# Altium schematic symbol library IC_TI.SCHLIB: 1162 symbols (part 6 of 8)
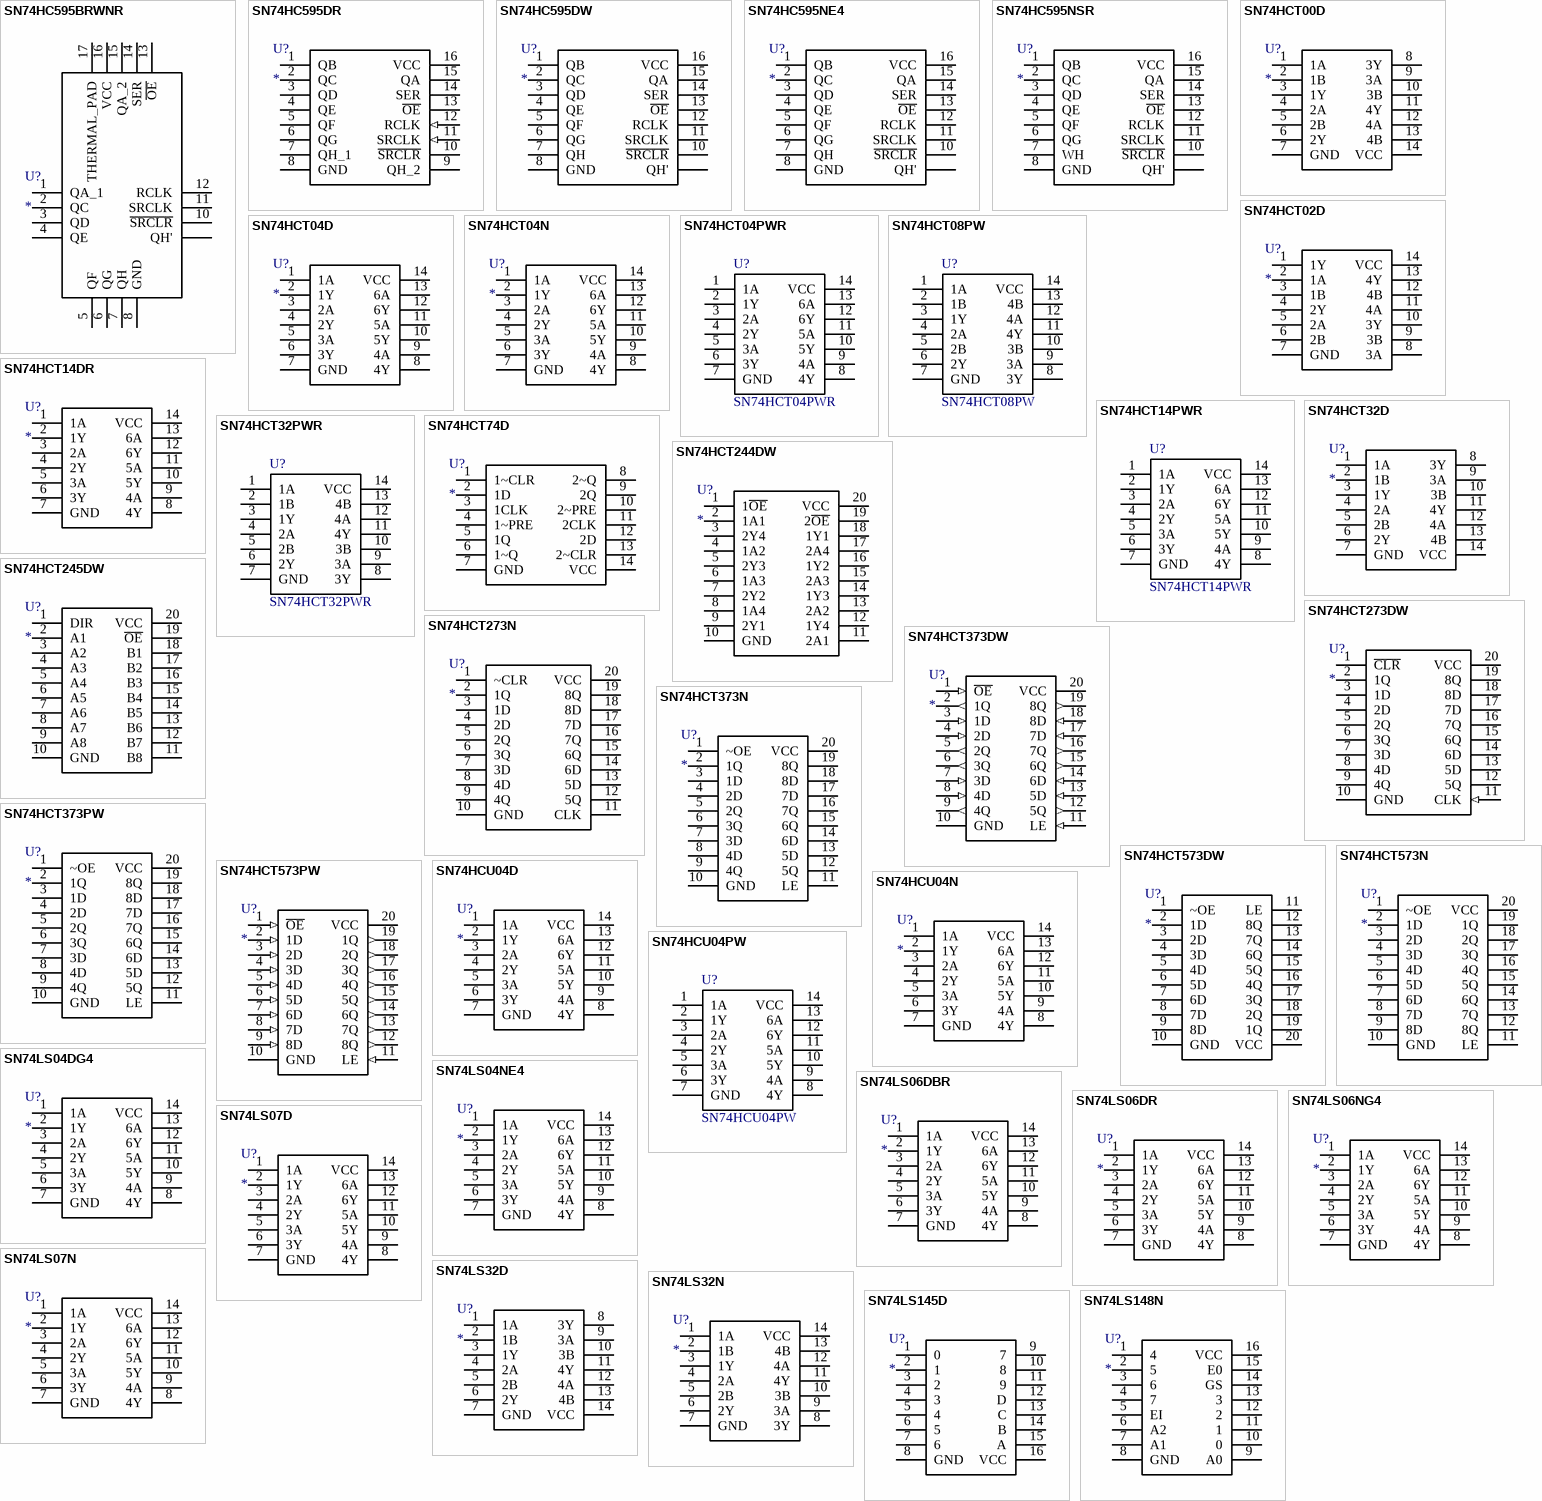
[diagram p40: symbols SN74HC595BRWNR to SN74LS148N]

## SN74LS07D
designator U?
Integrated Circuit; Manufacturer_Name: Texas Instruments; Manufacturer_Part_Number: SN74LS07D; Datasheet Link: http://www.ti.com/lit/ds/symlink/sn74ls07.pdf; Height: 1.75mm; Mouser Part Number: 595-SN74LS07D; Mouser Price/Stock: https://www.mouser.com/Search/Refine.aspx?Keyword=595-SN74LS07D; RS Part Number: 1218515; RS Price/Stock: http://uk.rs-online.com/web/p/products/1218515
footprint SOIC14_1.27
pins: 1 1A, 2 1Y, 3 2A, 4 2Y, 5 3A, 6 3Y, 7 GND (power), 8 4Y, 9 4A, 10 5Y, 11 5A, 12 6Y, 13 6A, 14 VCC (power)

## SN74LS07N
designator U?
Integrated Circuit; Manufacturer_Name: Texas Instruments; Manufacturer_Part_Number: SN74LS07N; Datasheet Link: http://componentsearchengine.com/Datasheets/1/SN74LS07N.pdf; Mouser Part Number: 595-SN74LS07N; Mouser Price/Stock: https://www.mouser.com/Search/Refine.aspx?Keyword=595-SN74LS07N; RS Part Number: 0442808; RS Price/Stock: http://uk.rs-online.com/web/p/products/0442808
footprint DIP14
pins: 1 1A, 2 1Y, 3 2A, 4 2Y, 5 3A, 6 3Y, 7 GND, 8 4Y, 9 4A, 10 5Y, 11 5A, 12 6Y, 13 6A, 14 VCC

## SN74LS32D
designator U?
Integrated Circuit; Manufacturer_Name: Texas Instruments; Manufacturer_Part_Number: SN74LS32D; Datasheet Link: http://componentsearchengine.com/Datasheets/3/SN74LS32D.pdf; Mouser Part Number: 595-SN74LS32D; Mouser Price/Stock: https://www.mouser.com/Search/Refine.aspx?Keyword=595-SN74LS32D; RS Part Number: 1792177; RS Price/Stock: http://uk.rs-online.com/web/p/products/1792177
footprint SOIC14_1.27
pins: 1 1A, 2 1B, 3 1Y, 4 2A, 5 2B, 6 2Y, 7 GND, 8 3Y, 9 3A, 10 3B, 11 4Y, 12 4A, 13 4B, 14 VCC

## SN74LS32N
designator U?
Integrated Circuit; Manufacturer_Name: Texas Instruments; Manufacturer_Part_Number: SN74LS32N; Datasheet Link: http://componentsearchengine.com/Datasheets/3/SN74LS32N.pdf; Mouser Part Number: 595-SN74LS32N; Mouser Price/Stock: https://www.mouser.com/Search/Refine.aspx?Keyword=595-SN74LS32N; RS Part Number: 3686382; RS Price/Stock: http://uk.rs-online.com/web/p/products/3686382
footprint DIP14
pins: 1 1A, 2 1B, 3 1Y, 4 2A, 5 2B, 6 2Y, 7 GND, 8 3Y, 9 3A, 10 3B, 11 4Y, 12 4A, 13 4B, 14 VCC

## SN74LS145D
designator U?
Integrated Circuit; Manufacturer_Name: Texas Instruments; Manufacturer_Part_Number: SN74LS145D; Mouser Part Number: 595-SN74LS145D; Mouser Price/Stock: https://www.mouser.com/Search/Refine.aspx?Keyword=595-SN74LS145D; RS Part Number: 1451076; RS Price/Stock: http://uk.rs-online.com/web/p/products/1451076
footprint SOIC16_1.27
pins: 1 0, 2 1, 3 2, 4 3, 5 4, 6 5, 7 6, 8 GND, 9 7, 10 8, 11 9, 12 D, 13 C, 14 B, 15 A, 16 VCC

## SN74LS148N
designator U?
Integrated Circuit; Manufacturer_Name: Texas Instruments; Manufacturer_Part_Number: SN74LS148N; Datasheet Link: http://docs-emea.rs-online.com/webdocs/00a3/0900766b800a3b12.pdf; Height: 5.08mm; Mouser Part Number: 595-SN74LS148N; Mouser Price/Stock: https://www.mouser.com/Search/Refine.aspx?Keyword=595-SN74LS148N; RS Part Number: 0640103P; RS Price/Stock: http://uk.rs-online.com/web/p/products/0640103P
footprint DIP16-A
pins: 1 4, 2 5, 3 6, 4 7, 5 EI, 6 A2, 7 A1, 8 GND (power), 9 A0, 10 0, 11 1, 12 2, 13 3, 14 GS, 15 E0, 16 VCC (power)

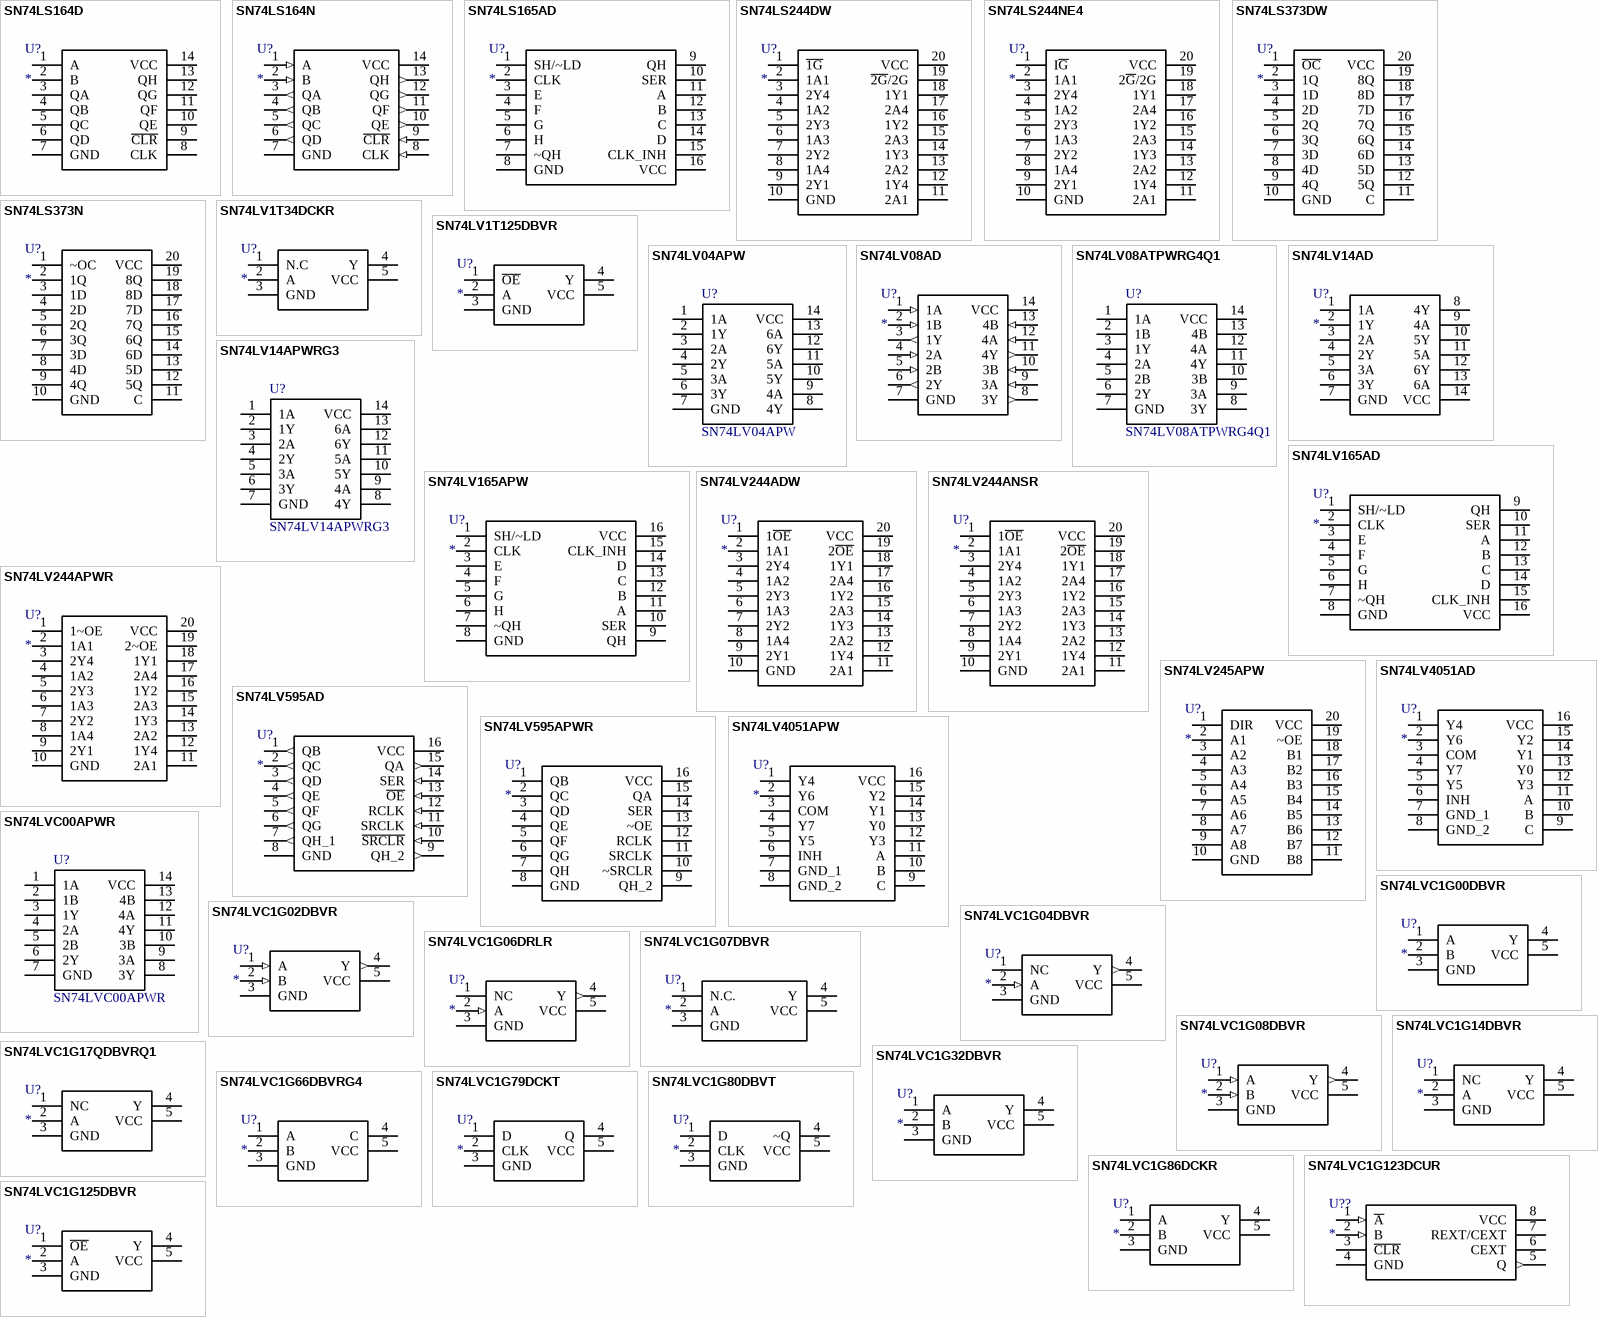
[diagram p23: symbols SN74LS164D to SN74LVC1G125DBVR]

## SN74LS164D
designator U?
Integrated Circuit; Manufacturer_Name: Texas Instruments; Manufacturer_Part_Number: SN74LS164D; Datasheet Link: http://uk.rs-online.com/web/p/products/6632448; Height: 1.75mm; Mouser Part Number: 595-SN74LS164D; Mouser Price/Stock: https://www.mouser.com/Search/Refine.aspx?Keyword=595-SN74LS164D; RS Part Number: 6632448; RS Price/Stock: http://uk.rs-online.com/web/p/products/6632448
footprint SOIC14_1.27
pins: 1 A, 2 B, 3 QA, 4 QB, 5 QC, 6 QD, 7 GND, 8 CLK, 9 ~{CLR}, 10 QE, 11 QF, 12 QG, 13 QH, 14 VCC

## SN74LS164N
designator U?
Integrated Circuit; Manufacturer_Name: Texas Instruments; Manufacturer_Part_Number: SN74LS164N; Datasheet Link: http://uk.rs-online.com/web/p/products/0305018; Height: 5.08mm; Mouser Part Number: 595-SN74LS164N; Mouser Price/Stock: https://www.mouser.com/Search/Refine.aspx?Keyword=595-SN74LS164N; RS Part Number: 0305018P; RS Price/Stock: http://uk.rs-online.com/web/p/products/0305018P
footprint DIP14-A
pins: 1 A (in), 2 B (in), 3 QA (out), 4 QB (out), 5 QC (out), 6 QD (out), 7 GND (power), 8 CLK (in), 9 ~{CLR} (in), 10 QE (out), 11 QF (out), 12 QG (out), 13 QH (out), 14 VCC (power)

## SN74LS165AD
designator U?
Integrated Circuit; Manufacturer_Name: Texas Instruments; Manufacturer_Part_Number: SN74LS165AD; Mouser Part Number: 595-SN74LS165AD; Mouser Price/Stock: https://www.mouser.com/Search/Refine.aspx?Keyword=595-SN74LS165AD; RS Part Number: 6632442P; RS Price/Stock: http://uk.rs-online.com/web/p/products/6632442P
footprint SOIC16_1.27
pins: 1 SH/~LD, 2 CLK, 3 E, 4 F, 5 G, 6 H, 7 ~QH, 8 GND, 9 QH, 10 SER, 11 A, 12 B, 13 C, 14 D, 15 CLK_INH, 16 VCC

## SN74LS244DW
designator U?
Integrated Circuit; Manufacturer_Name: Texas Instruments; Manufacturer_Part_Number: SN74LS244DW; Datasheet Link: http://www.ti.com/lit/ds/symlink/sn74ls244.pdf; Height: 2.65mm; Mouser Part Number: 595-SN74LS244DW; Mouser Price/Stock: https://www.mouser.com/Search/Refine.aspx?Keyword=595-SN74LS244DW; RS Part Number: 1218344; RS Price/Stock: http://uk.rs-online.com/web/p/products/1218344
footprint SOIC20W_1.27
pins: 1 ~{1G}, 2 1A1, 3 2Y4, 4 1A2, 5 2Y3, 6 1A3, 7 2Y2, 8 1A4, 9 2Y1, 10 GND (power), 11 2A1, 12 1Y4, 13 2A2, 14 1Y3, 15 2A3, 16 1Y2, 17 2A4, 18 1Y1, 19 ~{2G}/2G, 20 VCC (power)

## SN74LS244NE4
designator U?
Integrated Circuit; Manufacturer_Name: Texas Instruments; Manufacturer_Part_Number: SN74LS244NE4; Datasheet Link: http://www.ti.com/lit/ds/symlink/sn74ls241.pdf; Height: 5.08mm; Mouser Part Number: 595-SN74LS244NE4; Mouser Price/Stock: https://www.mouser.com/Search/Refine.aspx?Keyword=595-SN74LS244NE4
footprint DIP20-A
pins: 1 I~{G}, 2 1A1, 3 2Y4, 4 1A2, 5 2Y3, 6 1A3, 7 2Y2, 8 1A4, 9 2Y1, 10 GND, 11 2A1, 12 1Y4, 13 2A2, 14 1Y3, 15 2A3, 16 1Y2, 17 2A4, 18 1Y1, 19 2~{G}/2G, 20 VCC

## SN74LS373DW
designator U?
Integrated Circuit; Manufacturer_Name: Texas Instruments; Manufacturer_Part_Number: SN74LS373DW; Datasheet Link: http://docs-emea.rs-online.com/webdocs/0b85/0900766b80b85e6b.pdf; Height: 2.65mm; Mouser Part Number: 595-SN74LS373DW; Mouser Price/Stock: https://www.mouser.com/Search/Refine.aspx?Keyword=595-SN74LS373DW; RS Part Number: 0527334; RS Price/Stock: http://uk.rs-online.com/web/p/products/0527334
footprint SOIC20W_1.27
pins: 1 ~{OC}, 2 1Q, 3 1D, 4 2D, 5 2Q, 6 3Q, 7 3D, 8 4D, 9 4Q, 10 GND (power), 11 C, 12 5Q, 13 5D, 14 6D, 15 6Q, 16 7Q, 17 7D, 18 8D, 19 8Q, 20 VCC (power)

## SN74LS373N
designator U?
Integrated Circuit; Manufacturer_Name: Texas Instruments; Manufacturer_Part_Number: SN74LS373N; Datasheet Link: http://www.ti.com/lit/gpn/sn74ls373; Mouser Part Number: 595-SN74LS373N; Mouser Price/Stock: https://www.mouser.com/Search/Refine.aspx?Keyword=595-SN74LS373N; RS Part Number: 0309256; RS Price/Stock: http://uk.rs-online.com/web/p/products/0309256
footprint DIP20
pins: 1 ~OC, 2 1Q, 3 1D, 4 2D, 5 2Q, 6 3Q, 7 3D, 8 4D, 9 4Q, 10 GND, 11 C, 12 5Q, 13 5D, 14 6D, 15 6Q, 16 7Q, 17 7D, 18 8D, 19 8Q, 20 VCC

## SN74LV1T34DCKR
designator U?
Integrated Circuit; Manufacturer_Name: Texas Instruments; Manufacturer_Part_Number: SN74LV1T34DCKR; Datasheet Link: http://www.ti.com/lit/gpn/sn74lv1t34; Height: 1.1mm; Mouser Part Number: 595-SN74LV1T34DCKR; Mouser Price/Stock: https://www.mouser.com/Search/Refine.aspx?Keyword=595-SN74LV1T34DCKR
footprint SOT353
pins: 1 N.C, 2 A, 3 GND, 4 Y, 5 VCC

## SN74LV1T125DBVR
designator U?
Integrated Circuit; Manufacturer_Name: Texas Instruments; Manufacturer_Part_Number: SN74LV1T125DBVR; Datasheet Link: http://www.ti.com/general/docs/lit/getliterature.tsp?genericPartNumber=SN74LV1T125&&fileType=pdf; Height: 1.45mm; Mouser Part Number: 595-SN74LV1T125DBVR; Mouser Price/Stock: https://www.mouser.com/Search/Refine.aspx?Keyword=595-SN74LV1T125DBVR
footprint SOT23-5 (SOT23, 5-Leads, Body 3.0x3.0mm (max), Pitch 0.95mm, IPC Medium Density)
pins: 1 ~{OE}, 2 A, 3 GND, 4 Y, 5 VCC

## SN74LV04APW
designator U?
Integrated Circuit; Manufacturer_Name: Texas Instruments; Manufacturer_Part_Number: SN74LV04APW; Mouser Part Number: 595-SN74LV04APW; Mouser Price/Stock: https://www.mouser.com/Search/Refine.aspx?Keyword=595-SN74LV04APW
footprint TSSOP14_0.65 (TSOP, 14-Leads, Body 5.00x4.40mm, Pitch 0.65mm, Thermal Pad 2.31x2.46mm, IPC Low Density)
pins: 1 1A, 2 1Y, 3 2A, 4 2Y, 5 3A, 6 3Y, 7 GND, 8 4Y, 9 4A, 10 5Y, 11 5A, 12 6Y, 13 6A, 14 VCC

## SN74LV08AD
designator U?
Integrated Circuit; Manufacturer_Name: Texas Instruments; Manufacturer_Part_Number: SN74LV08AD; Datasheet Link: http://www.ti.com/lit/ds/scls387m/scls387m.pdf; Height: 1.75mm; Mouser Part Number: 595-SN74LV08AD; Mouser Price/Stock: https://www.mouser.com/Search/Refine.aspx?Keyword=595-SN74LV08AD; RS Part Number: 1792183; RS Price/Stock: http://uk.rs-online.com/web/p/products/1792183
footprint SOIC14_1.27
pins: 1 1A (in), 2 1B (in), 3 1Y (out), 4 2A (in), 5 2B (in), 6 2Y (out), 7 GND (power), 8 3Y (out), 9 3A (in), 10 3B (in), 11 4Y (out), 12 4A (in), 13 4B (in), 14 VCC (power)

## SN74LV08ATPWRG4Q1
designator U?
Integrated Circuit; Manufacturer_Name: Texas Instruments; Datasheet Link: http://www.ti.com/lit/gpn/sn74lv08a-q1; Height: 1.2mm; Manufacturer_Part_Number: SN74LV08ATPWRG4Q1; Mouser Part Number: 595-N74LV08ATPWRG4Q1; Mouser Price/Stock: https://www.mouser.com/Search/Refine.aspx?Keyword=595-N74LV08ATPWRG4Q1
footprint TSSOP14_0.65 (TSOP, 14-Leads, Body 5.00x4.40mm, Pitch 0.65mm, Thermal Pad 2.31x2.46mm, IPC Low Density)
pins: 1 1A, 2 1B, 3 1Y, 4 2A, 5 2B, 6 2Y, 7 GND, 8 3Y, 9 3A, 10 3B, 11 4Y, 12 4A, 13 4B, 14 VCC

## SN74LV14AD
designator U?
Integrated Circuit; Manufacturer_Name: Texas Instruments; Manufacturer_Part_Number: SN74LV14AD; Datasheet Link: http://www.ti.com/lit/gpn/sn74lv14a; Mouser Part Number: 595-SN74LV14AD; Mouser Price/Stock: https://www.mouser.com/Search/Refine.aspx?Keyword=595-SN74LV14AD; RS Part Number: 1450723; RS Price/Stock: http://uk.rs-online.com/web/p/products/1450723
footprint SOIC14_1.27
pins: 1 1A, 2 1Y, 3 2A, 4 2Y, 5 3A, 6 3Y, 7 GND, 8 4Y, 9 4A, 10 5Y, 11 5A, 12 6Y, 13 6A, 14 VCC

## SN74LV14APWRG3
designator U?
Integrated Circuit; Manufacturer_Name: Texas Instruments; Datasheet Link: http://www.ti.com/lit/ds/symlink/sn74lv14a.pdf; Height: 1.2mm; Manufacturer_Part_Number: SN74LV14APWRG3; Mouser Part Number: 595-SN74LV14APWRG3; Mouser Price/Stock: https://www.mouser.com/Search/Refine.aspx?Keyword=595-SN74LV14APWRG3
footprint TSSOP14_0.65 (TSOP, 14-Leads, Body 5.00x4.40mm, Pitch 0.65mm, Thermal Pad 2.31x2.46mm, IPC Low Density)
pins: 1 1A, 2 1Y, 3 2A, 4 2Y, 5 3A, 6 3Y, 7 GND, 8 4Y, 9 4A, 10 5Y, 11 5A, 12 6Y, 13 6A, 14 VCC

## SN74LV165AD
designator U?
Integrated Circuit; Manufacturer_Name: Texas Instruments; Manufacturer_Part_Number: SN74LV165AD; Mouser Part Number: 595-SN74LV165AD; Mouser Price/Stock: https://www.mouser.com/Search/Refine.aspx?Keyword=595-SN74LV165AD; RS Part Number: 6632713; RS Price/Stock: http://uk.rs-online.com/web/p/products/6632713
footprint SOIC16_1.27
pins: 1 SH/~LD, 2 CLK, 3 E, 4 F, 5 G, 6 H, 7 ~QH, 8 GND, 9 QH, 10 SER, 11 A, 12 B, 13 C, 14 D, 15 CLK_INH, 16 VCC

## SN74LV165APW
designator U?
Integrated Circuit; Manufacturer_Name: Texas Instruments; Manufacturer_Part_Number: SN74LV165APW; Datasheet Link: http://www.ti.com/lit/gpn/sn74lv165a; Mouser Part Number: 595-SN74LV165APW; Mouser Price/Stock: https://www.mouser.com/Search/Refine.aspx?Keyword=595-SN74LV165APW; RS Part Number: 1219235; RS Price/Stock: http://uk.rs-online.com/web/p/products/1219235
footprint TSSOP16_0.65 (Shrink Small Outline; 16 Leads; Body Width 4.4 mm; Pitch 0.65 mm)
pins: 1 SH/~LD, 2 CLK, 3 E, 4 F, 5 G, 6 H, 7 ~QH, 8 GND, 9 QH, 10 SER, 11 A, 12 B, 13 C, 14 D, 15 CLK_INH, 16 VCC

## SN74LV244ADW
designator U?
Integrated Circuit; Manufacturer_Name: Texas Instruments; Manufacturer_Part_Number: SN74LV244ADW; Datasheet Link: http://docs-emea.rs-online.com/webdocs/0b85/0900766b80b85e5e.pdf; Height: 2.65mm; Mouser Part Number: 595-SN74LV244ADW; Mouser Price/Stock: https://www.mouser.com/Search/Refine.aspx?Keyword=595-SN74LV244ADW; RS Part Number: 0526206; RS Price/Stock: http://uk.rs-online.com/web/p/products/0526206
footprint SOIC20W_1.27
pins: 1 1~{OE}, 2 1A1, 3 2Y4, 4 1A2, 5 2Y3, 6 1A3, 7 2Y2, 8 1A4, 9 2Y1, 10 GND (power), 11 2A1, 12 1Y4, 13 2A2, 14 1Y3, 15 2A3, 16 1Y2, 17 2A4, 18 1Y1, 19 2~{OE}, 20 VCC (power)

## SN74LV244ANSR
designator U?
Integrated Circuit; Manufacturer_Name: Texas Instruments; Manufacturer_Part_Number: SN74LV244ANSR; Datasheet Link: http://www.ti.com/lit/gpn/sn74lv244a; Height: 2mm; Mouser Part Number: 595-SN74LV244ANSR; Mouser Price/Stock: https://www.mouser.com/Search/Refine.aspx?Keyword=595-SN74LV244ANSR
footprint SOP20W_1.27
pins: 1 1~{OE}, 2 1A1, 3 2Y4, 4 1A2, 5 2Y3, 6 1A3, 7 2Y2, 8 1A4, 9 2Y1, 10 GND, 11 2A1, 12 1Y4, 13 2A2, 14 1Y3, 15 2A3, 16 1Y2, 17 2A4, 18 1Y1, 19 2~{OE}, 20 VCC

## SN74LV244APWR
designator U?
Integrated Circuit; Manufacturer_Name: Texas Instruments; Manufacturer_Part_Number: SN74LV244APWR; Datasheet Link: http://www.ti.com/lit/gpn/sn74lv244a; Mouser Part Number: 595-SN74LV244APWR; Mouser Price/Stock: https://www.mouser.com/Search/Refine.aspx?Keyword=595-SN74LV244APWR; RS Part Number: 6628471P; RS Price/Stock: http://uk.rs-online.com/web/p/products/6628471P
footprint TSSOP20_0.65 (TSOP, 20-Leads, Body 6.6x4.5mm (max), Pitch 0.65mm, IPC Medium Density)
pins: 1 1~OE, 2 1A1, 3 2Y4, 4 1A2, 5 2Y3, 6 1A3, 7 2Y2, 8 1A4, 9 2Y1, 10 GND, 11 2A1, 12 1Y4, 13 2A2, 14 1Y3, 15 2A3, 16 1Y2, 17 2A4, 18 1Y1, 19 2~OE, 20 VCC

## SN74LV245APW
designator U?
Integrated Circuit; Manufacturer_Name: Texas Instruments; Manufacturer_Part_Number: SN74LV245APW; Mouser Part Number: 595-SN74LV245APW; Mouser Price/Stock: https://www.mouser.com/Search/Refine.aspx?Keyword=595-SN74LV245APW
footprint TSSOP20_0.65 (TSOP, 20-Leads, Body 6.6x4.5mm (max), Pitch 0.65mm, IPC Medium Density)
pins: 1 DIR, 2 A1, 3 A2, 4 A3, 5 A4, 6 A5, 7 A6, 8 A7, 9 A8, 10 GND, 11 B8, 12 B7, 13 B6, 14 B5, 15 B4, 16 B3, 17 B2, 18 B1, 19 ~OE, 20 VCC

## SN74LV595AD
designator U?
Integrated Circuit; Manufacturer_Name: Texas Instruments; Manufacturer_Part_Number: SN74LV595AD; Datasheet Link: http://www.ti.com/lit/ds/symlink/sn74lv595a.pdf; Height: 1.75mm; RS Part Number: 527243; RS Price/Stock: http://uk.rs-online.com/web/p/counters-shift-registers/527243/?source=DS
footprint SOIC16_1.27
pins: 1 QB (out), 2 QC (out), 3 QD (out), 4 QE (out), 5 QF (out), 6 QG (out), 7 QH_1 (out), 8 GND (power), 9 QH_2 (out), 10 ~{SRCLR} (in), 11 SRCLK (in), 12 RCLK (in), 13 ~{OE} (in), 14 SER (in), 15 QA (out), 16 VCC (power)

## SN74LV595APWR
designator U?
Integrated Circuit; Manufacturer_Name: Texas Instruments; Manufacturer_Part_Number: SN74LV595APWR; Datasheet Link: http://www.ti.com/lit/gpn/sn74lv595a; Mouser Part Number: 595-SN74LV595APWR; Mouser Price/Stock: https://www.mouser.com/Search/Refine.aspx?Keyword=595-SN74LV595APWR; RS Part Number: 9222830; RS Price/Stock: http://uk.rs-online.com/web/p/products/9222830
footprint TSSOP16_0.65 (Shrink Small Outline; 16 Leads; Body Width 4.4 mm; Pitch 0.65 mm)
pins: 1 QB, 2 QC, 3 QD, 4 QE, 5 QF, 6 QG, 7 QH, 8 GND, 9 QH_2, 10 ~SRCLR, 11 SRCLK, 12 RCLK, 13 ~OE, 14 SER, 15 QA, 16 VCC

## SN74LV4051AD
designator U?
Integrated Circuit; Manufacturer_Name: Texas Instruments; Manufacturer_Part_Number: SN74LV4051AD; Datasheet Link: http://www.ti.com/lit/ds/symlink/sn74lv4051a.pdf; Height: 1.75mm; Mouser Part Number: 595-SN74LV4051AD; Mouser Price/Stock: https://www.mouser.com/Search/Refine.aspx?Keyword=595-SN74LV4051AD; RS Part Number: 6622741P; RS Price/Stock: http://uk.rs-online.com/web/p/products/6622741P
footprint SOIC16_1.27
pins: 1 Y4, 2 Y6, 3 COM, 4 Y7, 5 Y5, 6 INH, 7 GND_1, 8 GND_2, 9 C, 10 B, 11 A, 12 Y3, 13 Y0, 14 Y1, 15 Y2, 16 VCC

## SN74LV4051APW
designator U?
Integrated Circuit; Manufacturer_Name: Texas Instruments; Manufacturer_Part_Number: SN74LV4051APW; Datasheet Link: http://www.ti.com/lit/ds/symlink/sn74lv4051a.pdf; Height: 1.2mm; Mouser Part Number: 595-SN74LV4051APW; Mouser Price/Stock: https://www.mouser.com/Search/Refine.aspx?Keyword=595-SN74LV4051APW
footprint TSSOP16_0.65 (Shrink Small Outline; 16 Leads; Body Width 4.4 mm; Pitch 0.65 mm)
pins: 1 Y4, 2 Y6, 3 COM, 4 Y7, 5 Y5, 6 INH, 7 GND_1, 8 GND_2, 9 C, 10 B, 11 A, 12 Y3, 13 Y0, 14 Y1, 15 Y2, 16 VCC

## SN74LVC00APWR
designator U?
Integrated Circuit; Manufacturer_Name: Texas Instruments; Datasheet Link: http://www.ti.com/lit/gpn/sn74lvc00a; Manufacturer_Part_Number: SN74LVC00APWR; Mouser Part Number: 595-SN74LVC00APWR; Mouser Price/Stock: https://www.mouser.com/Search/Refine.aspx?Keyword=595-SN74LVC00APWR; RS Part Number: 0527249; RS Price/Stock: http://uk.rs-online.com/web/p/products/0527249
footprint TSSOP14_0.65 (TSOP, 14-Leads, Body 5.00x4.40mm, Pitch 0.65mm, Thermal Pad 2.31x2.46mm, IPC Low Density)
pins: 1 1A, 2 1B, 3 1Y, 4 2A, 5 2B, 6 2Y, 7 GND, 8 3Y, 9 3A, 10 3B, 11 4Y, 12 4A, 13 4B, 14 VCC

## SN74LVC1G00DBVR
designator U?
Integrated Circuit; Manufacturer_Name: Texas Instruments; Manufacturer_Part_Number: SN74LVC1G00DBVR; Datasheet Link: http://www.ti.com/lit/gpn/sn74lvc1g00; Mouser Part Number: 595-SN74LVC1G00DBVR; Mouser Price/Stock: https://www.mouser.com/Search/Refine.aspx?Keyword=595-SN74LVC1G00DBVR; RS Part Number: 1626695; RS Price/Stock: http://uk.rs-online.com/web/p/products/1626695
footprint SOT23-5 (SOT23, 5-Leads, Body 3.0x3.0mm (max), Pitch 0.95mm, IPC Medium Density)
pins: 1 A, 2 B, 3 GND, 4 Y, 5 VCC

## SN74LVC1G02DBVR
designator U?
Integrated Circuit; Manufacturer_Name: Texas Instruments; Manufacturer_Part_Number: SN74LVC1G02DBVR; Datasheet Link: http://www.ti.com/lit/gpn/sn74lvc1g02; Height: 1.45mm; Mouser Part Number: 595-SN74LVC1G02DBVR; Mouser Price/Stock: https://www.mouser.com/Search/Refine.aspx?Keyword=595-SN74LVC1G02DBVR
footprint SOT23-5 (SOT23, 5-Leads, Body 3.0x3.0mm (max), Pitch 0.95mm, IPC Medium Density)
pins: 1 A (in), 2 B (in), 3 GND (power), 4 Y (out), 5 VCC (power)

## SN74LVC1G04DBVR
designator U?
Integrated Circuit; Manufacturer_Name: Texas Instruments; Manufacturer_Part_Number: SN74LVC1G04DBVR; Datasheet Link: http://www.ti.com/lit/gpn/sn74lvc1g04; Height: 1.45mm; Mouser Part Number: 595-SN74LVC1G04DBVR; Mouser Price/Stock: https://www.mouser.com/Search/Refine.aspx?Keyword=595-SN74LVC1G04DBVR; RS Part Number: 1789003; RS Price/Stock: http://uk.rs-online.com/web/p/products/1789003
footprint SOT23-5 (SOT23, 5-Leads, Body 3.0x3.0mm (max), Pitch 0.95mm, IPC Medium Density)
pins: 1 NC, 2 A (in), 3 GND (power), 4 Y (out), 5 VCC (power)

## SN74LVC1G06DRLR
designator U?
Integrated Circuit; Manufacturer_Name: Texas Instruments; Manufacturer_Part_Number: SN74LVC1G06DRLR; Datasheet Link: http://www.ti.com/lit/gpn/sn74lvc1g06; Height: 0.6mm; Mouser Part Number: 595-SN74LVC1G06DRLR; Mouser Price/Stock: https://www.mouser.com/Search/Refine.aspx?Keyword=595-SN74LVC1G06DRLR
footprint SOT553
pins: 1 NC, 2 A (in), 3 GND (power), 4 Y (out), 5 VCC (power)

## SN74LVC1G07DBVR
designator U?
Integrated Circuit; Manufacturer_Name: Texas Instruments; Manufacturer_Part_Number: SN74LVC1G07DBVR; Datasheet Link: http://www.ti.com/lit/gpn/sn74lvc1g07; Mouser Part Number: 595-SN74LVC1G07DBVR; Mouser Price/Stock: https://www.mouser.com/Search/Refine.aspx?Keyword=595-SN74LVC1G07DBVR; RS Part Number: 1626699; RS Price/Stock: http://uk.rs-online.com/web/p/products/1626699
footprint SOT23-5 (SOT23, 5-Leads, Body 3.0x3.0mm (max), Pitch 0.95mm, IPC Medium Density)
pins: 1 N.C., 2 A, 3 GND, 4 Y, 5 VCC

## SN74LVC1G08DBVR
designator U?
Integrated Circuit; Manufacturer_Name: Texas Instruments; Manufacturer_Part_Number: SN74LVC1G08DBVR; Datasheet Link: http://www.ti.com/lit/ds/symlink/sn74lvc1g08.pdf; Height: 1.45mm; Mouser Part Number: 595-SN74LVC1G08DBVR; Mouser Price/Stock: https://www.mouser.com/Search/Refine.aspx?Keyword=595-SN74LVC1G08DBVR
footprint SOT23-5 (SOT23, 5-Leads, Body 3.0x3.0mm (max), Pitch 0.95mm, IPC Medium Density)
pins: 1 A (in), 2 B (in), 3 GND (power), 4 Y (out), 5 VCC (power)

## SN74LVC1G14DBVR
designator U?
Integrated Circuit; Manufacturer_Name: Texas Instruments; Manufacturer_Part_Number: SN74LVC1G14DBVR; Datasheet Link: http://www.farnell.com/datasheets/1965693.pdf; Height: 1.45mm; Mouser Part Number: 595-SN74LVC1G14DBVR; Mouser Price/Stock: https://www.mouser.com/Search/Refine.aspx?Keyword=595-SN74LVC1G14DBVR
footprint SOT23-5 (SOT23, 5-Leads, Body 3.0x3.0mm (max), Pitch 0.95mm, IPC Medium Density)
pins: 1 NC, 2 A, 3 GND, 4 Y, 5 VCC
